# Altium integrated library remote.IntLib: 15 symbols
Pins are listed as number, name and electrical type; pins without a type are passive.

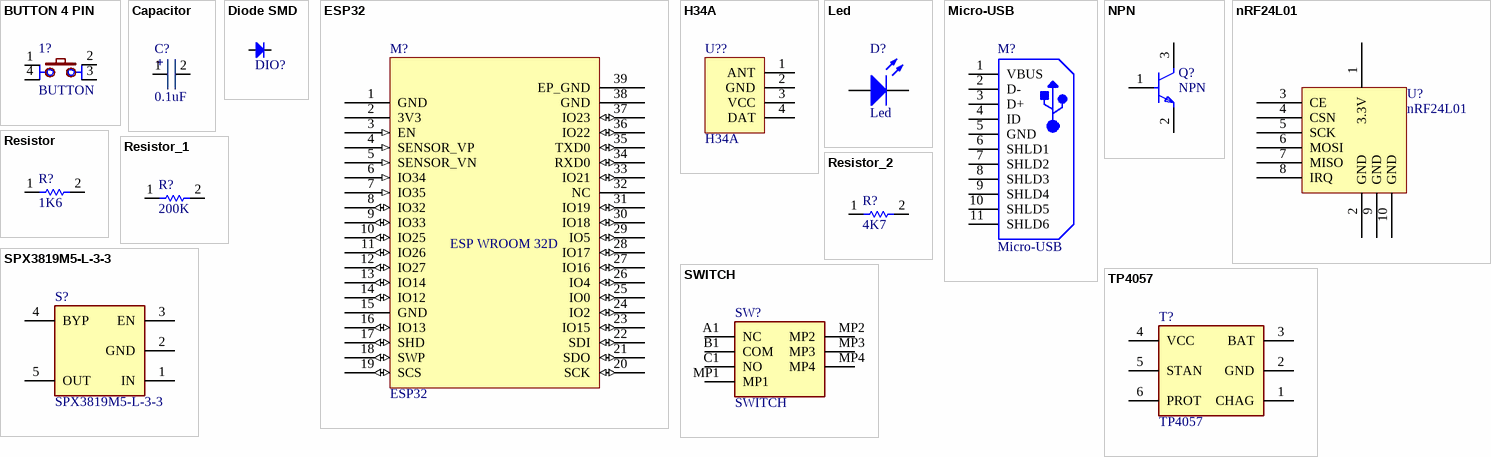
[diagram p0: symbols BUTTON 4 PIN to TP4057]

## BUTTON 4 PIN
designator 1?, comment BUTTON
Manufacturer: Texas Instruments; Manufacturer Part Number: NE555DR; Frequency: 100kHz; Low Level Output Current: 200mA; Quiescent Current: 15mA; Min Supply Voltage: 4.5V; Number of Timers/Counters: 1; Max Supply Voltage: 16V; Operating Supply Current: 10mA; High Level Output Current: -200mA; Packaging: Tape and Reel; Weight: 0.002561oz; REACH SVHC: No SVHC; Package Quantity: 2500; Width: 3.91mm; Max Operating Temperature: 70°C; Contact Plating: Gold; Lead Free: Lead Free; Number of Pins: 8; Min Operating Temperature: 0°C; Radiation Hardening: No; Length: 4.9mm; Case/Package: SOIC; Height: 1.58mm; Mount: Surface Mount
footprint BUTTON 4X4mm
pins: 1, 2, 3, 4

## Capacitor
designator C?, comment 0.1uF
General Purpose Ceramic Capacitor, 0603, 1nF, 10%, X7R, 15%, 50V; Manufacturer: Kyocera AVX; Manufacturer Part Number: 06035C102KAT2A; Case Code (Metric): 1608; Min Operating Temperature: -55°C; Weight: 7.1E-05oz; Series: -; Capacitance: 1nF; RoHS Compliant: Yes; Radiation Hardening: No; Height: 0.9mm; Mount: Surface Mount; REACH SVHC: No SVHC; Lead Free: Lead Free; Depth: 0.81mm; Voltage: 50V; Number of Pins: 2; Voltage Rating: 50V; Max Operating Temperature: 125°C; Termination: SMD/SMT; Construction: Flat; Case Code (Imperial): 0603; Dielectric: X7R; Width: 0.032inch; Tolerance: 10%; Case/Package: 0603; Contact Plating: Tin; Packaging: Tape and Reel; Voltage Rating (DC): 50V; Dielectric Material: Ceramic; Package Quantity: 4000; Thickness: 0.035inch; Length: 1.6mm
footprint 1000uF 16V N
footprint Cap_0603_A
pins: 1, 2
text: +

## Diode SMD
designator DIO?  (value not drawn)
Default Diode; Code - JEDEC: DO-214-AB; Value: 1N5007; Published: 8-Jun-2000; Revision: July-2002: Re-released for DXP Platform.; Publisher: Altium Limited
footprint DIO-SMD-106
footprint DIO-SMD-123
footprint DIO-SMD-A
footprint DIO-SMD-B (Magnetic-Core Inductor with Winding Polarity Marking; 2 Leads)
footprint DIO-SMD-216AA (DO216AA ST-MITE)
footprint DIO-SMD-222AA (DO216AA ST-MITE)
pins: 1 A, 2 K

## ESP32
designator M?
footprint ESP32-WROOM-32D
pins: 1 GND, 2 3V3, 3 EN (in), 4 SENSOR_VP (in), 5 SENSOR_VN (in), 6 IO34 (in), 7 IO35 (in), 8 IO32 (io), 9 IO33 (io), 10 IO25 (io), 11 IO26 (io), 12 IO27 (io), 13 IO14 (io), 14 IO12 (io), 15 GND, 16 IO13 (io), 17 SHD (io), 18 SWP (io), 19 SCS (io), 20 SCK (io), 21 SDO (io), 22 SDI (io), 23 IO15 (io), 24 IO2 (io), 25 IO0 (io), 26 IO4 (io), 27 IO16 (io), 28 IO17 (io), 29 IO5 (io), 30 IO18 (io), 31 IO19 (io), 32 NC, 33 IO21 (io), 34 RXD0 (io), 35 TXD0 (io), 36 IO22 (io), 37 IO23 (io), 38 GND, 39 EP_GND
text: ESP WROOM 32D

## H34A
designator U??
footprint H34A
pins: 1 ANT, 2 GND, 3 VCC, 4 DAT

## Led
designator D?
footprint LED 0603
pins: 1 A, 2 K

## Micro-USB
designator M?
footprint 2.0 5 PIN SMD (ID 1981568-1)
pins: 1 VBUS, 2 D-, 3 D+, 4 ID, 5 GND, 6 SHLD1, 7 SHLD2, 8 SHLD3, 9 SHLD4, 10 SHLD5, 11 SHLD6

## NPN
designator Q?
footprint FP-SOT23-IPC_C
pins: 1 B, 2 E, 3 C

## nRF24L01
designator U?
footprint nRF24L01 SMD
footprint NRF24L01 + PA DIG
footprint NRF24L01 + PA SMD
footprint nRF24L01 DIG
footprint nRF24L01 DIG SMD
footprint NRF24l01 +PA +LNA DIG
pins: 1 3.3V, 2 GND, 3 CE, 4 CSN, 5 SCK, 6 MOSI, 7 MISO, 8 IRQ, 9 GND, 10 GND

## Resistor
designator R?, comment 1K6
footprint Res_0603
pins: 1, 2

## Resistor_1
designator R?, comment 200K
footprint Res_0603
pins: 1, 2

## Resistor_2
designator R?, comment 4K7
footprint Res_0603
pins: 1, 2

## SPX3819M5-L-3-3
designator S?
Regulator 250mA
footprint FP-C04-091-OT-IPC_A
pins: 1 IN (power), 2 GND, 3 EN (power), 4 BYP (power), 5 OUT

## SWITCH
designator SW?
footprint MSK12C02
pins: A1 NC, B1 COM, C1 NO, MP1, MP2, MP3, MP4

## TP4057
designator T?
footprint TP4057
pins: 1 CHAG (power), 2 GND, 3 BAT (power), 4 VCC (power), 5 STAN, 6 PROT